# Altium footprint library DIP Component.PcbLib: 327 footprints (part 8 of 21)
Each footprint in its own frame and in the unit in brackets; x right, y up, seen from the top. Pads: shape width x height; smd on the part's side, far side on the other; paste and mask are expansions set on the pad; w line width, h text height; cw(c..) or ccw(c..) is an arc to the next point about the centre after c.
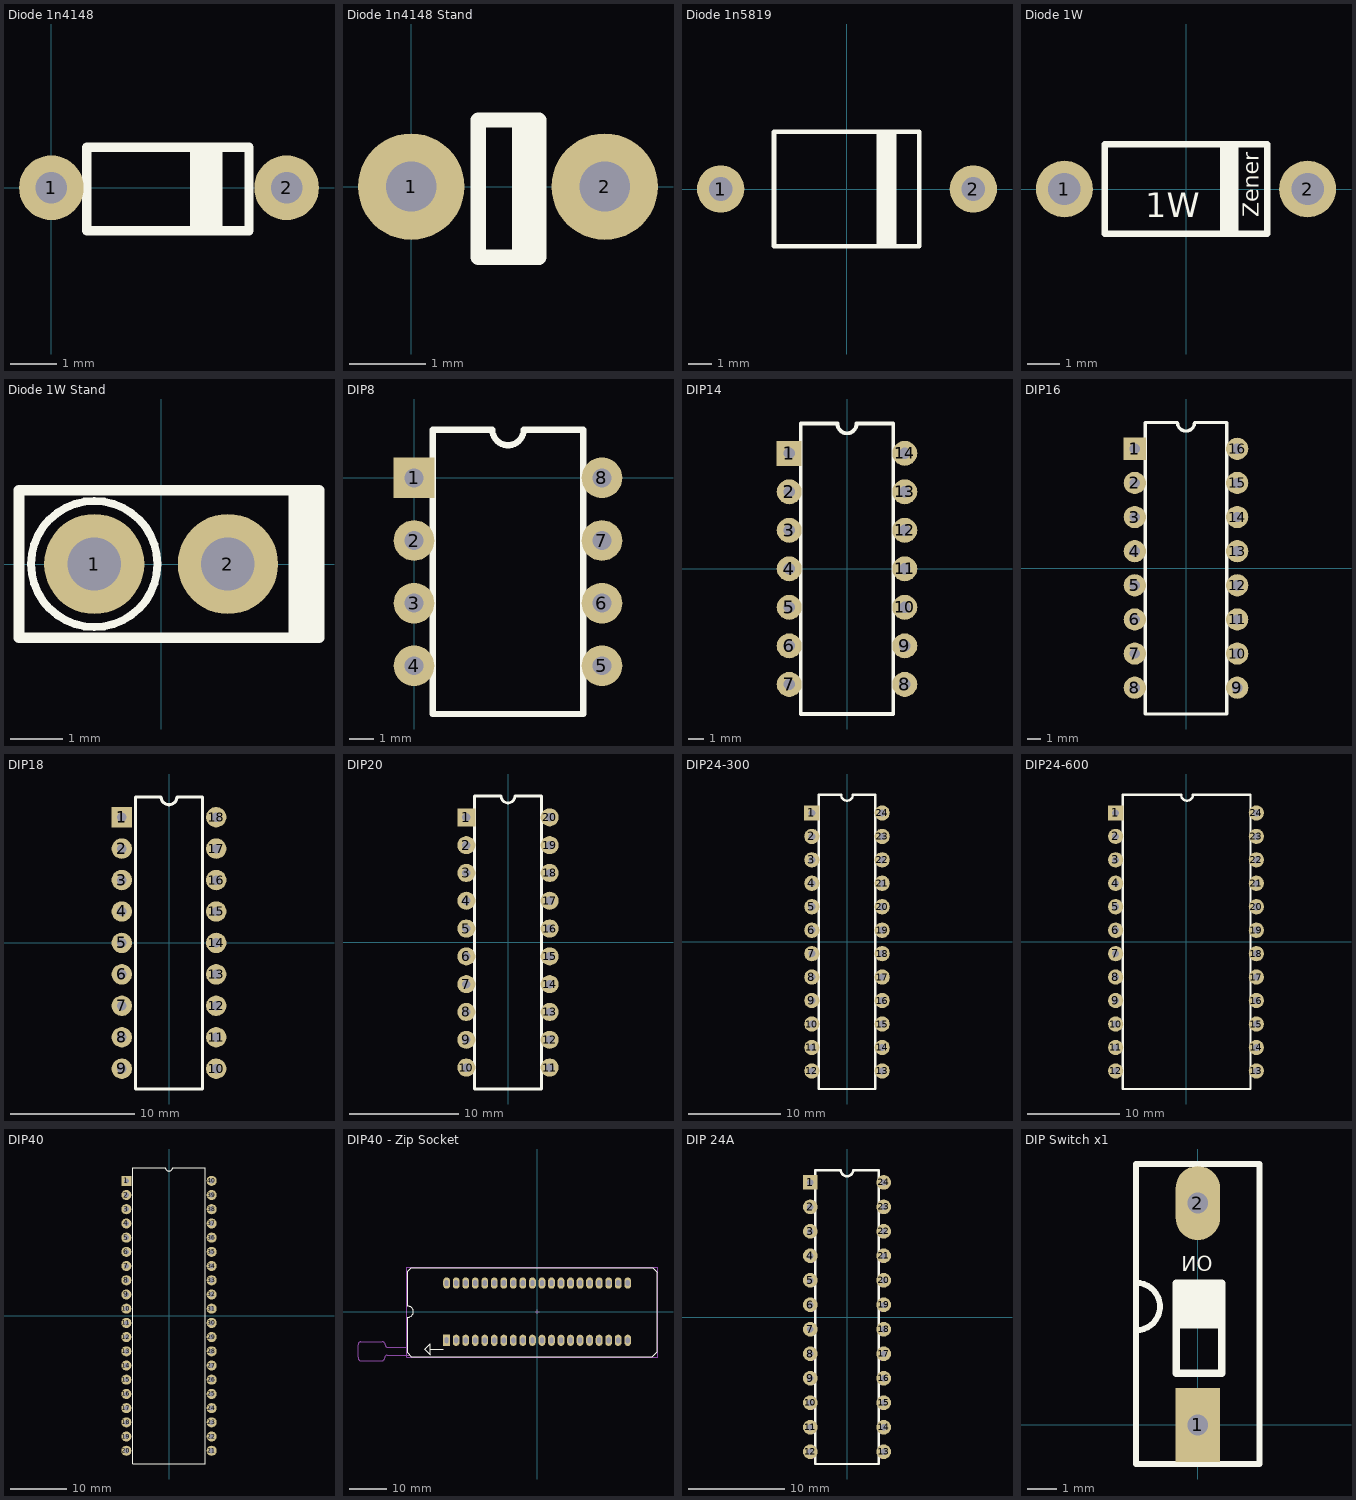
[diagram p7: the footprints below, top view; thin cyan lines are the x and y axes]

## Diode 1n4148 [mil]
pads (2):
  round 55 hole 27: 1(0,0) 2(200,0)
Top Overlay:
  rectangle: 117.72,-36.5 145.28,34.37
  lines w7.87: 30.12,-36.5 167.91,-36.5 167.91,34.37 30.12,34.37 30.12,-36.5
3D body "1N4148.STEP": height 71.22, standoff -40, extent -6.5,-31.96 210.5,33

## Diode 1n4148 Stand [mil]
pads (2):
  round 55 hole 26: 1(0,0) 2(100,0)
Top Overlay:
  rectangle: 51.97,-36.87 64.03,34
  lines w7.87: 34.65,-36.5 66.03,-36.5 66.03,34.37 34.65,34.37 34.65,-36.5
3D body "1N4148_Stand_V2008.STEP": height 216.61, standoff -40, extent -32,-32 108.98,32.96

## Diode 1n5819 [mm] "Schottkey 1.0A 40V"
pads (2):
  round 2 hole 1: 1(-5.334,0) 2(5.334,0)
Top Overlay:
  rectangle: 1.247,-2.413 2.097,2.413
  lines w0.2: -3.083,-2.413 -3.083,2.413 3.047,2.413 3.047,-2.413 -3.083,-2.413
3D body "User Library-1N5819.STEP": height 5.38, standoff -1.98, extent -5.71,-2.375 5.71,2.375

## Diode 1W [mil]
height 122.05
pads (2):
  round 70 hole 40: 1(-150,0) 2(150,0)
Top Overlay:
  rectangle: 42,-55 65,55
  lines w7.87: -100,-55 -100,55 100,55 100,-55 -100,-55
  text "1W" at -50,-35 h30
  text "Zener" at 90,-35 h19.68
3D body "Zener 1W.STEP": height 131.24, standoff -39.37, extent -166,-52.5 165,52.5

## Diode 1W Stand [mil]
pads (2):
  round 75 hole 40: 1(-50,0) 2(50,0)
Top Overlay:
  circle w5.91: c-50,0 r47.24
  rectangle: 95.47,-55 118.11,55
  lines w7.87: -106.3,-55 -106.3,55 118.11,55 118.11,-55 -106.3,-55
3D body "Zener 1W_Stand.STEP": height 291.09, standoff -39.37, extent -103,-52 65,53

## DIP8 [mil]
pads (8):
  rect 65x65 hole 30: 1(0,0)
  round 65 hole 30: 2(0,-100) 3(0,-200) 4(0,-300) 5(300,-300) 6(300,-200) 7(300,-100) 8(300,0)
Top Overlay:
  lines w10: 30,-377 270,-377 270,77 175,77 cw(c150,77) 125,77 30,77 30,-377
3D body "SW3DPS-DIP8-DEFAULT.step": height 165, standoff -105, extent -5,-375 305,75

## DIP14 [mil]
pads (14):
  rect 65x65 hole 30: 1(-150,300)
  round 65 hole 30: 2(-150,200) 3(-150,100) 4(-150,0) 5(-150,-100) 6(-150,-200) 7(-150,-300) 8(150,-300) 9(150,-200) 10(150,-100) 11(150,0) 12(150,100) 13(150,200) 14(150,300)
Top Overlay:
  lines w10: -120,-377 120,-377 120,377 25,377 cw(c0,377) -25,377 -120,377 -120,-377
3D body "SW3dPS-DIP14-300.step": height 200, standoff -98.03, extent -154.92,-383.86 154.92,383.86

## DIP16 [mil]
pads (16):
  rect 65x65 hole 30: 1(-150,350)
  round 65 hole 30: 2(-150,250) 3(-150,150) 4(-150,50) 5(-150,-50) 6(-150,-150) 7(-150,-250) 8(-150,-350) 9(150,-350) 10(150,-250) 11(150,-150) 12(150,-50) 13(150,50) 14(150,150) 15(150,250) 16(150,350)
Top Overlay:
  lines w10: -120,-427 120,-427 120,427 25,427 cw(c0,427) -25,427 -120,427 -120,-427
3D body "SW3dPS-DIP16-300.step": height 200, standoff -98.03, extent -154.92,-393.7 154.92,393.7

## DIP18 [mil]
pads (18):
  rect 65x65 hole 30: 1(-150,400)
  round 65 hole 30: 2(-150,300) 3(-150,200) 4(-150,100) 5(-150,0) 6(-150,-100) 7(-150,-200) 8(-150,-300) 9(-150,-400) 10(150,-400) 11(150,-300) 12(150,-200) 13(150,-100) 14(150,0) 15(150,100) 16(150,200) 17(150,300) 18(150,400)
Top Overlay:
  lines w10: -106.3,-464.57 -106.3,464.57 -25,464.57 ccw(c0,464.57) 25,464.57 106.3,464.57 106.3,-464.57 -106.3,-464.57
3D body "SW3dPS-DIP18-300.step": height 200, standoff -98.03, extent -154.92,-452.56 154.92,452.56

## DIP20 [mil]
pads (20):
  rect 65x65 hole 30: 1(-150,450)
  round 65 hole 30: 2(-150,350) 3(-150,250) 4(-150,150) 5(-150,50) 6(-150,-50) 7(-150,-150) 8(-150,-250) 9(-150,-350) 10(-150,-450) 11(150,-450) 12(150,-350) 13(150,-250) 14(150,-150) 15(150,-50) 16(150,50) 17(150,150) 18(150,250) 19(150,350) 20(150,450)
Top Overlay:
  lines w10: -120,-527 120,-527 120,527 25,527 cw(c0,527) -25,527 -120,527 -120,-527
Mechanical 1:
  drawing of 264 lines, arcs and shapes, not listed
3D body: height 101, standoff 100, extent -25.5,501.6 25.5,532.1
3D body: height 35, standoff -75, extent -155,441 -145,459
3D body: height 75, standoff 35, extent -155,425 -145,475
3D body: height 75, standoff 65, extent -145,425 -125,475
3D body: height 100, standoff 30, extent -125,-527 125,532
3D body: height 115, standoff 100, extent -125,-527 125,532
3D body: height 75, standoff 65, extent -145,325 -125,375
3D body: height 75, standoff 35, extent -155,325 -145,375
3D body: height 35, standoff -75, extent -155,341 -145,359
3D body: height 75, standoff 65, extent -145,225 -125,275
3D body: height 75, standoff 35, extent -155,225 -145,275
3D body: height 35, standoff -75, extent -155,241 -145,259
3D body: height 75, standoff 65, extent -145,125 -125,175
3D body: height 75, standoff 35, extent -155,125 -145,175
3D body: height 35, standoff -75, extent -155,141 -145,159
3D body: height 75, standoff 65, extent -145,25 -125,75
3D body: height 75, standoff 35, extent -155,25 -145,75
3D body: height 35, standoff -75, extent -155,41 -145,59
3D body: height 75, standoff 65, extent -145,-75 -125,-25
3D body: height 75, standoff 35, extent -155,-75 -145,-25
3D body: height 35, standoff -75, extent -155,-59 -145,-41
3D body: height 75, standoff 65, extent -145,-175 -125,-125
3D body: height 75, standoff 35, extent -155,-175 -145,-125
3D body: height 35, standoff -75, extent -155,-159 -145,-141
3D body: height 75, standoff 65, extent 125,-175 145,-125
3D body: height 75, standoff 35, extent 145,-175 155,-125
3D body: height 35, standoff -75, extent 145,-159 155,-141
3D body: height 75, standoff 65, extent 125,-75 145,-25
3D body: height 75, standoff 35, extent 145,-75 155,-25
3D body: height 35, standoff -75, extent 145,-59 155,-41
3D body: height 75, standoff 65, extent 125,25 145,75
3D body: height 75, standoff 35, extent 145,25 155,75
3D body: height 35, standoff -75, extent 145,41 155,59
3D body: height 75, standoff 65, extent 125,125 145,175
3D body: height 75, standoff 35, extent 145,125 155,175
3D body: height 35, standoff -75, extent 145,141 155,159
3D body: height 75, standoff 65, extent 125,225 145,275
3D body: height 75, standoff 35, extent 145,225 155,275
3D body: height 35, standoff -75, extent 145,241 155,259
3D body: height 75, standoff 65, extent 125,325 145,375
3D body: height 75, standoff 35, extent 145,325 155,375
3D body: height 35, standoff -75, extent 145,341 155,359
3D body: height 75, standoff 65, extent 125,425 145,475
3D body: height 75, standoff 35, extent 145,425 155,475
3D body: height 35, standoff -75, extent 145,441 155,459
3D body: height 35, standoff -75, extent -155,-259 -145,-241
3D body: height 75, standoff 35, extent -155,-275 -145,-225
3D body: height 75, standoff 65, extent -145,-275 -125,-225
3D body: height 35, standoff -75, extent 144,-259 154,-241
3D body: height 75, standoff 35, extent 144,-275 154,-225
3D body: height 75, standoff 65, extent 124,-275 144,-225
3D body: height 75, standoff 65, extent -145,-375 -125,-325
3D body: height 75, standoff 35, extent -155,-375 -145,-325
3D body: height 35, standoff -75, extent -155,-359 -145,-341
3D body: height 75, standoff 65, extent -145,-475 -125,-425
3D body: height 75, standoff 35, extent -155,-475 -145,-425
3D body: height 35, standoff -75, extent -155,-459 -145,-441
3D body: height 75, standoff 65, extent 125,-475 145,-425
3D body: height 75, standoff 35, extent 145,-475 155,-425
3D body: height 35, standoff -75, extent 145,-459 155,-441
3D body: height 75, standoff 65, extent 125,-375 145,-325
3D body: height 75, standoff 35, extent 145,-375 155,-325
3D body: height 35, standoff -75, extent 145,-359 155,-341

## DIP24-300 [mil]
pads (24):
  rect 65x65 hole 30: 1(-150,550)
  round 65 hole 30: 2(-150,450) 3(-150,350) 4(-150,250) 5(-150,150) 6(-150,50) 7(-150,-50) 8(-150,-150) 9(-150,-250) 10(-150,-350) 11(-150,-450) 12(-150,-550) 13(150,-550) 14(150,-450) 15(150,-350) 16(150,-250) 17(150,-150) 18(150,-50) 19(150,50) 20(150,150) 21(150,250) 22(150,350) 23(150,450) 24(150,550)
Top Overlay:
  lines w10: -120,-627 120,-627 120,627 25,627 cw(c0,627) -25,627 -120,627 -120,-627
3D body "SW3dPS-DIP24-300.step": height 200, standoff -98.03, extent -154.92,-635.04 154.92,635.04

## DIP24-600 [mil]
pads (24):
  rect 65x65 hole 30: 1(-300,550)
  round 65 hole 30: 2(-300,450) 3(-300,350) 4(-300,250) 5(-300,150) 6(-300,50) 7(-300,-50) 8(-300,-150) 9(-300,-250) 10(-300,-350) 11(-300,-450) 12(-300,-550) 13(300,-550) 14(300,-450) 15(300,-350) 16(300,-250) 17(300,-150) 18(300,-50) 19(300,50) 20(300,150) 21(300,250) 22(300,350) 23(300,450) 24(300,550)
Top Overlay:
  lines w10: -21.47,627 -270,627 -270,-627 275,-627 275,627 29.47,627 cw(c4.47,626.98) -20.53,626.98
3D body "SW3dPS-DIP24-600.step": height 224.41, standoff -101.57, extent -304.92,-635.04 304.92,635.04

## DIP40 [mm]
pads (40):
  rect 1.8x1.8 hole 0.9: 1(-7.62,24.13)
  round 1.8 hole 0.9: 2(-7.62,21.59) 3(-7.62,19.05) 4(-7.62,16.51) 5(-7.62,13.97) 6(-7.62,11.43) 7(-7.62,8.89) 8(-7.62,6.35) 9(-7.62,3.81) 10(-7.62,1.27) 11(-7.62,-1.27) 12(-7.62,-3.81) 13(-7.62,-6.35) 14(-7.62,-8.89) 15(-7.62,-11.43) 16(-7.62,-13.97) 17(-7.62,-16.51) 18(-7.62,-19.05) 19(-7.62,-21.59) 20(-7.62,-24.13) 21(7.62,-24.13) 22(7.62,-21.59) 23(7.62,-19.05) 24(7.62,-16.51) 25(7.62,-13.97) 26(7.62,-11.43) 27(7.62,-8.89) 28(7.62,-6.35) 29(7.62,-3.81) 30(7.62,-1.27) 31(7.62,1.27) 32(7.62,3.81) 33(7.62,6.35) 34(7.62,8.89) 35(7.62,11.43) 36(7.62,13.97) 37(7.62,16.51) 38(7.62,19.05) 39(7.62,21.59) 40(7.62,24.13)
Top Overlay:
  lines w0.2: -6.45,-26.5 -6.45,26.5 -0.635,26.5 ccw(c0,26.5) 0.635,26.5 6.45,26.5 6.45,-26.5 -6.45,-26.5
3D body "SW3dPS-DIP40-600.step": height 5.7, standoff -2.58, extent -7.745,-26.225 7.745,26.225

## DIP40 - Zip Socket [mm] "40 Pin Zip Socket DESIGNER : ABBAS BASEREH"
height 12
pads (40):
  rect 1.8x3 hole 1 slot 1.5 at 90 deg mask+0.06: 1(-24.13,-7.62)
  oval 1.8x3 hole 1 slot 1.5 at 90 deg mask+0.06: 2(-21.59,-7.62) 3(-19.05,-7.62) 4(-16.51,-7.62) 5(-13.97,-7.62) 6(-11.43,-7.62) 7(-8.89,-7.62) 8(-6.35,-7.62) 9(-3.81,-7.62) 10(-1.27,-7.62) 11(1.27,-7.62) 12(3.81,-7.62) 13(6.35,-7.62) 14(8.89,-7.62) 15(11.43,-7.62) 16(13.97,-7.62) 17(16.51,-7.62) 18(19.05,-7.62) 19(21.59,-7.62) 20(24.13,-7.62) 21(24.13,7.62) 22(21.59,7.62) 23(19.05,7.62) 24(16.51,7.62) 25(13.97,7.62) 26(11.43,7.62) 27(8.89,7.62) 28(6.35,7.62) 29(3.81,7.62) 30(1.27,7.62) 31(-1.27,7.62) 32(-3.81,7.62) 33(-6.35,7.62) 34(-8.89,7.62) 35(-11.43,7.62) 36(-13.97,7.62) 37(-16.51,7.62) 38(-19.05,7.62) 39(-21.59,7.62) 40(-24.13,7.62)
Top Overlay:
  lines w0.2: -28.5,-10 -25,-10 ; -34.5,-10.992 -33.492,-12 30.722,-12 32,-10.722 32,10.508 30.808,11.7 -33.578,11.7 -34.5,10.778 -34.5,1.5 cw(c-34.5,0) -34.5,-1.5 -34.5,-10.992 ; -30,-10 -28.5,-8.5 -28.5,-11.5 -30,-10
Mechanical 13:
  lines w0.2: -34.5,-9.5 -39.795,-9.5 cw(c-39.795,-8.808) -40.488,-8.808 ccw(c-41.269,-8.808) -41.269,-8.026 -46.965,-8.026 ccw(c-46.965,-8.808) -47.746,-8.808 -47.746,-12.198 ccw(c-46.812,-12.198) -46.812,-13.132 -41.478,-13.132 ccw(c-41.478,-12.243) -40.589,-12.243 cw(c-39.903,-12.243) -39.903,-11.557 -34.135,-11.557
Mechanical 15:
  lines w0.2: -0.5,0 0.5,0 ; 0,-0.5 0,0.5 ; -34.7,-12.2 32.2,-12.2 32.2,11.9 -34.7,11.9 -34.7,-12.2
3D body "Zif-Zip Socket.STEP": height 21.95, standoff -2.53, extent -41.579,-12.975 31.475,11.501

## DIP 24A [mil]
pads (24):
  rect 60x60 hole 25: 1(-150,550)
  round 60 hole 25: 2(-150,450) 3(-150,350) 4(-150,250) 5(-150,150) 6(-150,50) 7(-150,-50) 8(-150,-150) 9(-150,-250) 10(-150,-350) 11(-150,-450) 12(-150,-550) 13(150,-550) 14(150,-450) 15(150,-350) 16(150,-250) 17(150,-150) 18(150,-50) 19(150,50) 20(150,150) 21(150,250) 22(150,350) 23(150,450) 24(150,550)
Top Overlay:
  lines w10: -130,-600 -130,600 -25,600 ccw(c0,600) 25,600 130,600 130,-600 -130,-600
Mechanical 1:
  drawing of 288 lines, arcs and shapes, not listed
3D body: height 75, standoff 65, extent 135,525 145,575
3D body: height 75, standoff 35, extent 145,525 155,575
3D body: height 35, standoff -75, extent 145,541 155,559
3D body: height 75, standoff 65, extent 135,425 145,475
3D body: height 75, standoff 35, extent 145,425 155,475
3D body: height 35, standoff -75, extent 145,441 155,459
3D body: height 75, standoff 65, extent 135,325 145,375
3D body: height 75, standoff 35, extent 145,325 155,375
3D body: height 35, standoff -75, extent 145,341 155,359
3D body: height 75, standoff 65, extent 135,225 145,275
3D body: height 75, standoff 35, extent 145,225 155,275
3D body: height 35, standoff -75, extent 145,241 155,259
3D body: height 75, standoff 65, extent 135,125 145,175
3D body: height 75, standoff 35, extent 145,125 155,175
3D body: height 35, standoff -75, extent 145,141 155,159
3D body: height 75, standoff 65, extent 135,25 145,75
3D body: height 75, standoff 35, extent 145,25 155,75
3D body: height 35, standoff -75, extent 145,41 155,59
3D body: height 75, standoff 65, extent 135,-75 145,-25
3D body: height 75, standoff 35, extent 145,-75 155,-25
3D body: height 35, standoff -75, extent 145,-59 155,-41
3D body: height 75, standoff 65, extent 135,-175 145,-125
3D body: height 75, standoff 35, extent 145,-175 155,-125
3D body: height 35, standoff -75, extent 145,-159 155,-141
3D body: height 75, standoff 65, extent 135,-275 145,-225
3D body: height 75, standoff 35, extent 145,-275 155,-225
3D body: height 35, standoff -75, extent 145,-259 155,-241
3D body: height 75, standoff 65, extent 135,-375 145,-325
3D body: height 75, standoff 35, extent 145,-375 155,-325
3D body: height 35, standoff -75, extent 145,-359 155,-341
3D body: height 75, standoff 65, extent 135,-475 145,-425
3D body: height 75, standoff 35, extent 145,-475 155,-425
3D body: height 35, standoff -75, extent 145,-459 155,-441
3D body: height 75, standoff 65, extent 135,-575 145,-525
3D body: height 75, standoff 35, extent 145,-575 155,-525
3D body: height 35, standoff -75, extent 145,-559 155,-541
3D body: height 75, standoff 65, extent -145,-575 -135,-525
3D body: height 75, standoff 35, extent -155,-575 -145,-525
3D body: height 35, standoff -75, extent -155,-559 -145,-541
3D body: height 75, standoff 65, extent -145,-475 -135,-425
3D body: height 75, standoff 35, extent -155,-475 -145,-425
3D body: height 35, standoff -75, extent -155,-459 -145,-441
3D body: height 75, standoff 65, extent -145,-375 -135,-325
3D body: height 75, standoff 35, extent -155,-375 -145,-325
3D body: height 35, standoff -75, extent -155,-359 -145,-341
3D body: height 75, standoff 65, extent -145,-275 -135,-225
3D body: height 75, standoff 35, extent -155,-275 -145,-225
3D body: height 35, standoff -75, extent -155,-259 -145,-241
3D body: height 75, standoff 65, extent -145,-175 -135,-125
3D body: height 75, standoff 35, extent -155,-175 -145,-125
3D body: height 35, standoff -75, extent -155,-159 -145,-141
3D body: height 75, standoff 65, extent -145,-75 -135,-25
3D body: height 75, standoff 35, extent -155,-75 -145,-25
3D body: height 35, standoff -75, extent -155,-59 -145,-41
3D body: height 75, standoff 65, extent -145,25 -135,75
3D body: height 75, standoff 35, extent -155,25 -145,75
3D body: height 35, standoff -75, extent -155,41 -145,59
3D body: height 75, standoff 65, extent -145,125 -135,175
3D body: height 75, standoff 35, extent -155,125 -145,175
3D body: height 35, standoff -75, extent -155,141 -145,159
3D body: height 75, standoff 65, extent -145,225 -135,275
3D body: height 75, standoff 35, extent -155,225 -145,275
3D body: height 35, standoff -75, extent -155,241 -145,259
3D body: height 75, standoff 65, extent -145,325 -135,375
3D body: height 75, standoff 35, extent -155,325 -145,375
3D body: height 35, standoff -75, extent -155,341 -145,359
3D body: height 75, standoff 65, extent -145,425 -135,475
3D body: height 75, standoff 35, extent -155,425 -145,475
3D body: height 35, standoff -75, extent -155,441 -145,459
3D body: height 115, standoff 100, extent -135,-605 135,605
3D body: height 100, standoff 30, extent -135,-605 135,605
3D body: height 35, standoff -75, extent -155,541 -145,559
3D body: height 75, standoff 35, extent -155,525 -145,575
3D body: height 0, standoff 0, extent -155,525 -155,575
3D body: height 75, standoff 65, extent -145,525 -135,575

## DIP Switch x1 [mm] "Switch DIP 1 way flat slide Thru-Hole-Design:Ali Hafizi"
height 6.5
pads (2):
  rect 1.5x2.5 hole 0.7: 1(0,0)
  oval 1.5x2.5 hole 0.7: 2(0,7.5)
Top Overlay:
  region: -0.746,4.79 -0.746,3.265 0.81,3.265 0.81,4.79
  lines w0.2: -2.08,3.202 ccw(c-2.08,4.002) -2.08,4.802 ; -2.09,-1.32 2.08,-1.32 2.08,8.82 -2.09,8.82 -2.09,-1.32
  lines w0.25: -0.73,1.74 -0.73,4.79
  lines w0.254: -0.73,1.74 0.81,1.74 0.81,4.79 -0.73,4.79
  text "ON" at 0.5,5.2 h0.5
3D body "User Library-dips sith 1.step": height 7.33, standoff -2.14, extent -1.94,-1.11 1.885,8.64